# Altium footprint library Ultrascale_PcbLib.PcbLib: 126 footprints (part 1 of 8)
Each footprint in its own frame and in the unit in brackets; x right, y up, seen from the top. Pads: shape width x height; smd on the part's side, far side on the other; paste and mask are expansions set on the pad; w line width, h text height; cw(c..) or ccw(c..) is an arc to the next point about the centre after c.
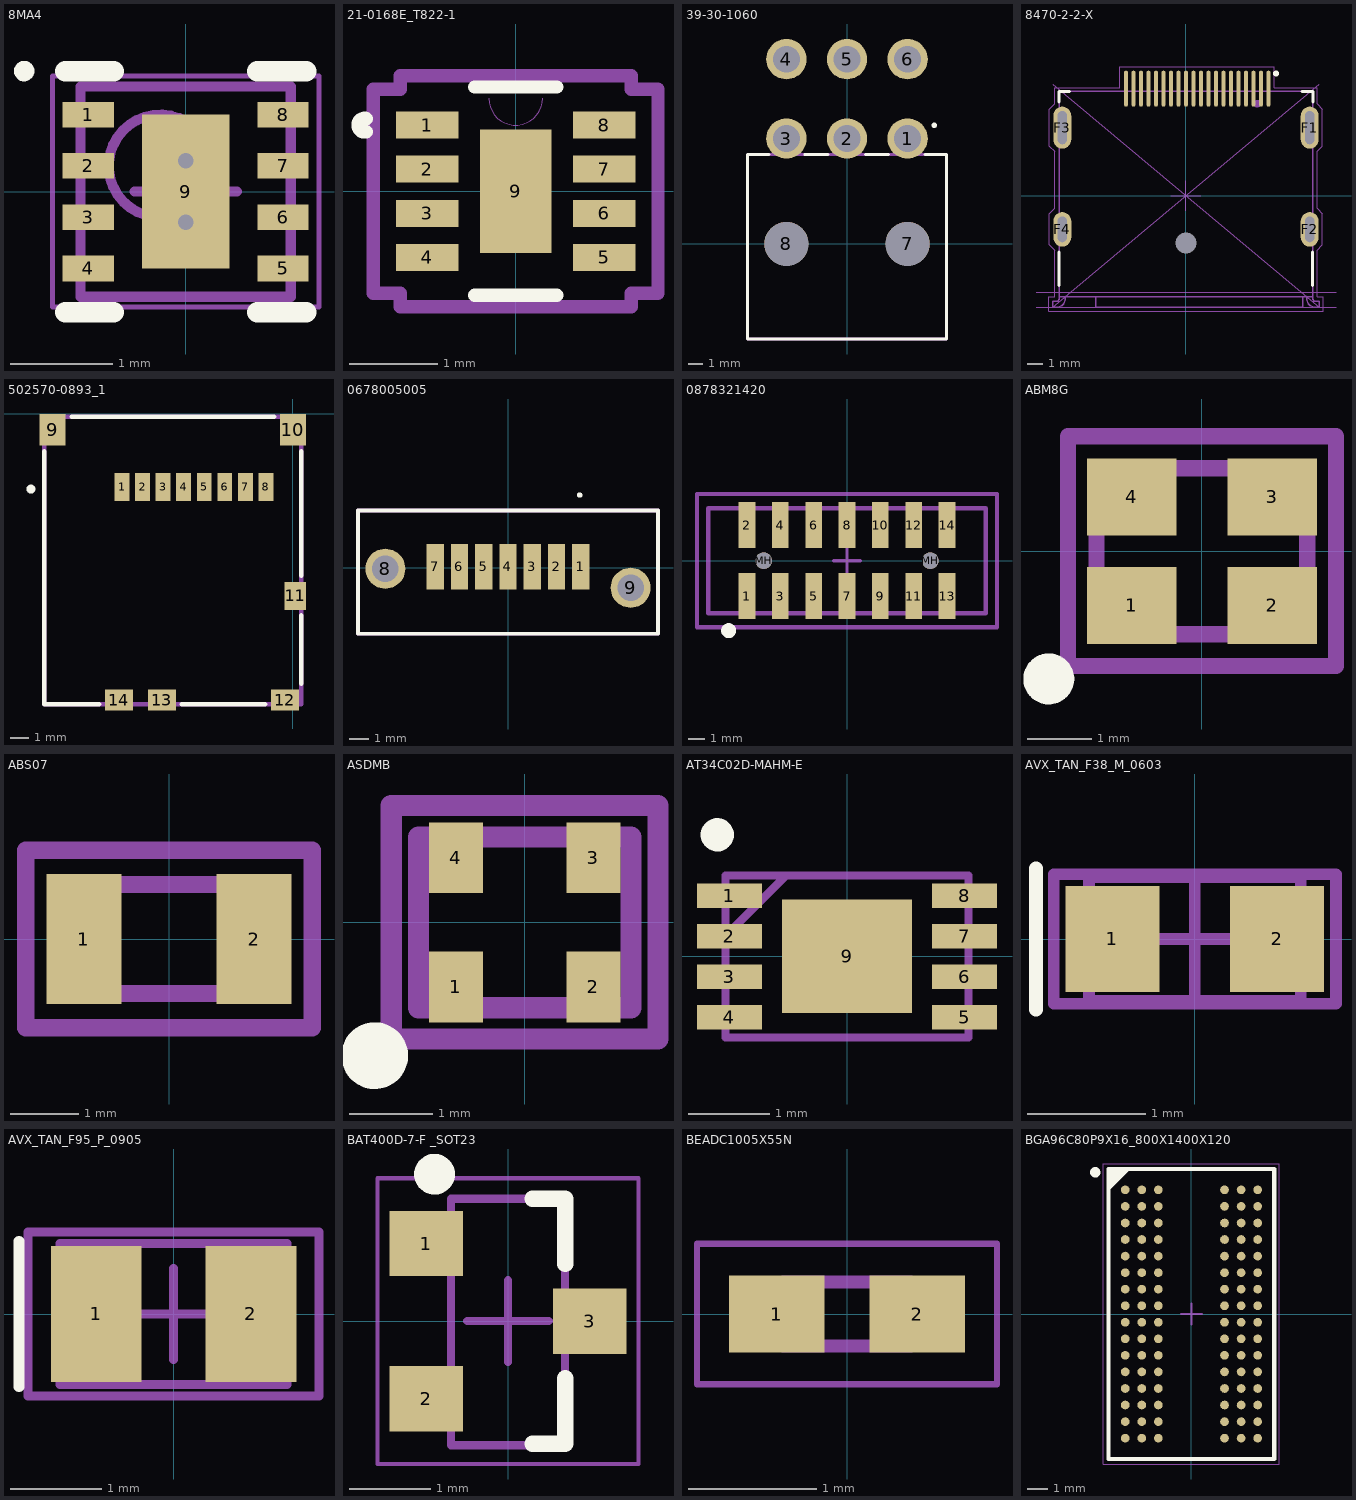
[diagram p0: the footprints below, top view; thin cyan lines are the x and y axes]

## 8MA4 [mm] "SON, 8-Leads, Body 2x2mm, Pitch 0.5mm"
height 0.6
pads (9):
  rect 0.5x0.25 smd: 1(-0.95,0.75) 2(-0.95,0.25) 3(-0.95,-0.25) 4(-0.95,-0.75) 5(0.95,-0.75) 6(0.95,-0.25) 7(0.95,0.25) 8(0.95,0.75)
  rect 0.85x1.5 smd: 9(0,0)
via 0,0.3 diameter 0.3 hole 0.152
via 0,-0.3 diameter 0.3 hole 0.152
Top Overlay:
  circle w0.1: c-1.575,1.175 r0.05
  lines w0.2: -1.175,-1.175 -0.7,-1.175 ; -1.175,1.175 -0.7,1.175 ; 0.7,-1.175 1.175,-1.175 ; 0.7,1.175 1.175,1.175
Mechanical 13:
  circle w0.1: c-0.25,0.25 r0.5
  lines w0.1: -1.025,-1.025 -1.025,1.025 1.025,1.025 1.025,-1.025 -1.025,-1.025
Mechanical 15:
  lines w0.05: -1.3,-1.125 -1.3,1.125 1.3,1.125 1.3,-1.125 -1.3,-1.125
  lines w0.1: -0.5,0 0.5,0 ; 0,-0.5 0,0.5
3D body: height 0.6, standoff 0, extent -1.024,-1.024 1.024,1.024

## 21-0168E_T822-1 [mil]
pads (9):
  rect 28x12 smd: 1(-39.5,29.53) 2(-39.5,9.84) 3(-39.5,-9.84) 4(-39.5,-29.53) 5(39.5,-29.53) 6(39.5,-9.84) 7(39.5,9.84) 8(39.5,29.53)
  rect 32x55 smd paste-27: 9(0,0)
Top Overlay:
  lines w6: -66.6,26.62 cw(c-67.34,29.53) -66.6,32.43 ; -18.34,-46.5 18.34,-46.5 ; -18.34,46.5 18.34,46.5
Top Paste:
  region: 16,27.5 -16,27.5 -16,-27.5 16,-27.5
Mechanical 13:
  lines w0: -12,41.5 ccw(c0,41.5) 12,41.5
Mechanical 15:
  lines w6: -63.5,-45.53 -51.5,-45.53 -51.5,-51.5 51.5,-51.5 51.5,-45.53 63.5,-45.53 63.5,45.53 51.5,45.53 51.5,51.5 -51.5,51.5 -51.5,45.53 -63.5,45.53 -63.5,-45.53
3D body: height 10, standoff 0, extent 0,0 10,10
3D body "MAX8902BATA+T.stp": height 31.5, standoff 0, extent -41.33,-39.36 41.35,39.38

## 39-30-1060 [mm]
pads (8):
  round 2.8 hole 1.85: 1(4.2,7.3) 2(0,7.3) 3(-4.2,7.3) 4(-4.2,12.8) 5(0,12.8) 6(4.2,12.8)
  round 3.05 hole 3.05 unplated: 7(4.2,0) 8(-4.2,0)
Top Overlay:
  circle w0.2: c6.048,8.213 r0.092
  lines w0.2: -5.4,6.2 -6.9,6.2 -6.9,-6.6 6.9,-6.6 6.9,6.2 5.4,6.2 ; -2.93,6.2 -1.315,6.2 ; 1.27,6.2 2.885,6.2
Mechanical 15:
  lines w0.2: -6.9,-6.6 6.9,-6.6 6.9,6.2 -6.9,6.2 -6.9,-6.6
3D body "39-30-1060.stp": height 11.01, standoff -3.99, extent -6.9,-6.567 7.3,13.367

## 8470-2-2-X [mm]
pads (25):
  oval 0.28x2.4 smd: 1(5.5,7.142) 2(5,7.142) 3(4.5,7.142) 4(4,7.142) 5(3.5,7.142) 6(3,7.142) 7(2.5,7.142) 8(2,7.142) 9(1.5,7.142) 10(1,7.142) 11(0.5,7.142) 12(0,7.142) 13(-0.5,7.142) 14(-1,7.142) 15(-1.5,7.142) 16(-2,7.142) 17(-2.5,7.142) 18(-3,7.142) 19(-3.5,7.142) 20(-4,7.142)
  oval 1.2x2.8 hole 0.6 slot 2.2 at 90 deg: F1(8.25,4.542) F3(-8.25,4.542)
  oval 1.2x2.3 hole 0.6 slot 1.7 at 90 deg: F2(8.25,-2.238) F4(-8.25,-2.238)
  round 0 hole 1.4 unplated: H1(0,-3.138)
Top Overlay:
  circle w0.2: c6,8.152 r0.1
  lines w0.2: -8.45,-5.998 -8.45,-3.748 ; -8.45,6.252 -8.45,6.952 -7.75,6.952 ; 7.75,6.952 8.45,6.952 8.45,6.252 ; 8.45,-5.998 8.45,-3.748
Mechanical 13:
  circle w0.5: c4.75,6.142 r0.01
  lines w0.1: -8.045,-6.738 -8.045,-6.838 cw(c-8.645,-6.838) -8.645,-7.438 -8.895,-7.438 -8.895,-7.038 -8.645,-7.038 ccw(c-8.645,-6.843) -8.45,-6.843 -8.45,-6.738 ; -6,-6.738 -6,-7.438 7.645,-7.438 7.795,-7.438 7.795,-6.738 ; 8.045,-6.738 8.045,-6.838 ccw(c8.645,-6.838) 8.645,-7.438 8.895,-7.438 8.895,-7.038 8.645,-7.038 cw(c8.645,-6.843) 8.45,-6.843 8.45,-6.738 ; -8.45,-6.738 -8.45,6.952 8.45,6.952 8.45,-6.738 ; -8.45,-6.738 8.45,-6.738
  text ".Designator" at 1.25,0.7 h1
Mechanical 15:
  lines w0.05: -10,-7.438 10,-7.438 ; -10,-6.418 10,-6.418 ; -8.895,-7.438 8.89,7.442 ; -8.895,7.442 8.89,-7.438 ; -1,0 1,0 ; 0,-1 0,1 ; -9.15,-7.698 9.15,-7.698 9.15,-6.748 8.75,-6.748 8.75,-3.628 9.1,-3.278 9.1,-1.248 9.1,-1.198 8.75,-0.848 8.75,2.952 9.1,3.302 9.1,5.782 8.75,6.132 8.75,7.202 5.9,7.202 5.9,8.602 -4.4,8.602 -4.4,7.202 -8.75,7.202 -8.75,6.132 -9.1,5.782 -9.1,3.302 -8.75,2.952 -8.75,-0.848 -9.1,-1.198 -9.1,-1.248 -9.1,-3.278 -8.75,-3.628 -8.75,-6.748 -9.15,-6.748 -9.15,-7.698
  text "PCB Edge" at 0.95,-6.2 h0.5
  text "Connector Edge" at 0.9,-7.25 h0.5
3D body "472720001.stp": height 6.65, standoff -2.1, extent -8.895,-7.448 8.89,7.442

## 502570-0893_1 [mm] "CONN MICRO SD CARD PUSH-PUSH R/A"
pads (14):
  rect 0.8x1.5 smd: 1(-9.15,-3.9) 2(-8.05,-3.9) 3(-6.95,-3.9) 4(-5.85,-3.9) 5(-4.75,-3.9) 6(-3.65,-3.9) 7(-2.55,-3.9) 8(-1.45,-3.9)
  rect 1.4x1.7 smd: 9(-12.875,-0.85) 10(0,-0.85)
  rect 1.15x1.5 smd: 11(0.125,-9.75)
  rect 1.5x1.15 smd: 12(-0.425,-15.325) 13(-7.025,-15.325) 14(-9.325,-15.325)
Top Overlay:
  circle w0.254: c-14.037,-4.023 r0.114
  lines w0.254: -13.325,-2 -13.325,-15.55 -10.393,-15.55 ; -11.85,-0.15 -1.011,-0.15 ; -5.95,-15.55 -1.5,-15.55 ; 0.45,-14.453 0.45,-10.8 ; 0.45,-8.669 0.45,-2
Mechanical 15:
  lines w0.254: -13.325,-15.55 -13.325,-0.15 0.45,-0.15 0.45,-15.55 -13.325,-15.55
3D body "5025700893.stp": height 1.81, standoff 0.01, extent -13.4,-15.6 0.4,-0.1

## 0678005005 [mm]
pads (9):
  rect 0.9x2.4 smd: 1(3.795,0.05) 2(2.525,0.05) 3(1.255,0.05) 4(-0.015,0.05) 5(-1.285,0.05) 6(-2.555,0.05) 7(-3.825,0.05)
  round 2.1 hole 1.4: 8(-6.43,-0.05) 9(6.4,-1.05)
Top Overlay:
  circle w0.2: c3.737,3.8 r0.04
  lines w0.2: -7.86,-3.45 -7.86,3 7.83,3 7.83,-3.45 -7.86,-3.45
Mechanical 15:
  lines w0.2: -7.86,-3.45 -7.86,3 7.83,3 7.83,-3.45 -7.86,-3.45

## 0878321420 [mm] "CONN HEADER 14POS 2MM VERT SMD"
height 7.6
pads (16):
  rect 1x2.75 smd paste+0.05 mask+0.05: 1(-6,-2.13) 2(-6,2.13) 3(-4,-2.13) 4(-4,2.13) 5(-2,-2.13) 6(-2,2.13) 7(0,-2.13) 8(0,2.13) 9(2,-2.13) 10(2,2.13) 11(4,-2.13) 12(4,2.13) 13(6,-2.13) 14(6,2.13)
  round 1 hole 1 unplated paste-2 mask+0.1: MH(-5,0) MH(5,0)
Top Overlay:
  circle w0.5: c-7.1,-4.2 r0.2
Mechanical 13:
  lines w0.254: -8.325,-3.15 8.325,-3.15 8.325,3.15 -8.325,3.15 -8.325,-3.15
Mechanical 15:
  lines w0.2: -0.8,0 0.8,0 ; 0,-0.8 0,0.8
  lines w0.254: -9,-4 9,-4 9,4 -9,4 -9,-4
Mechanical 29:
  text ".Designator" at -6.74,-3.07 h1.52
3D body "878321420.stp": height 7.6, standoff -0.75, extent -8.325,-3.15 8.325,3.15

## ABM8G [mm] "Abracon ABM8G Series Crystals"
height 1
pads (4):
  rect 1.4x1.2 smd mask+0.05: 1(-1.1,-0.85) 2(1.1,-0.85) 3(1.1,0.85) 4(-1.1,0.85)
Top Overlay:
  circle w0.4: c-2.4,-2 r0.2
Mechanical 13:
  lines w0.254: -1.65,-1.3 -1.65,1.3 1.65,1.3 1.65,-1.3 -1.65,-1.3
Mechanical 15:
  lines w0.254: -2.1,-1.8 2.1,-1.8 2.1,1.8 -2.1,1.8 -2.1,-1.8
3D body "ABM8G.STEP": height 0.99, standoff 0, extent -1.6,-1.244 1.6,1.245

## ABS07 [mm] "Abracon ABS07 Series Crystals"
height 0.9
pads (2):
  rect 1.1x1.9 smd mask+0.05: 1(-1.25,0) 2(1.25,0)
Mechanical 13:
  lines w0.254: -1.65,-0.8 -1.65,0.8 1.65,0.8 1.65,-0.8 -1.65,-0.8
Mechanical 15:
  lines w0.254: -2.1,-1.3 2.1,-1.3 2.1,1.3 -2.1,1.3 -2.1,-1.3
3D body "ABS07.STEP": height 0.89, standoff 0, extent -1.6,-0.749 1.6,0.749

## ASDMB [mm] "Abracon ASDMB Series Oscillators"
height 0.9
pads (4):
  rect 0.65x0.85 smd mask+0.05: 1(-0.825,-0.775) 2(0.825,-0.775) 3(0.825,0.775) 4(-0.825,0.775)
Top Overlay:
  circle w0.4: c-1.8,-1.6 r0.2
Mechanical 13:
  lines w0.254: -1.275,-1.025 -1.275,1.025 1.275,1.025 1.275,-1.025 -1.275,-1.025
Mechanical 15:
  lines w0.254: -1.6,-1.4 1.6,-1.4 1.6,1.4 -1.6,1.4 -1.6,-1.4
3D body "ASDMB.STEP": height 0.86, standoff 0.01, extent -1.25,-1 1.25,1

## AT34C02D-MAHM-E [mm] "IC EEPROM 2KBIT 1MHZ 8UDFN"
pads (9):
  rect 0.8x0.3 smd mask+0.07: 1(-1.45,0.75) 2(-1.45,0.25) 3(-1.45,-0.25) 4(-1.45,-0.75) 5(1.45,-0.75) 6(1.45,-0.25) 7(1.45,0.25) 8(1.45,0.75)
  rect 1.6x1.4 smd mask+0.07: 9(0,0)
Top Overlay:
  circle w0.25: c-1.6,1.5 r0.08
Mechanical 15:
  lines w0.1: -1.5,0.25 -0.75,1 ; -1.5,-1 1.5,-1 1.5,1 -1.5,1 -1.5,-1
3D body "AT34C02D-MAHM-E.stp": height 0.6, standoff 0, extent -1.55,-1 1.55,1

## AVX_TAN_F38_M_0603 [mm] "AVX F38 Series Tantalum Cap. M Package"
height 0.9
pads (2):
  rect 0.8x0.9 smd: 1(-0.7,0) 2(0.7,0)
Top Overlay:
  lines w0.12: -1.35,-0.6 -1.35,0.6
Mechanical 13:
  lines w0.1: -0.9,-0.525 0.9,-0.525 0.9,0.525 -0.9,0.525 -0.9,-0.525
Mechanical 15:
  lines w0.1: -0.475,0 0.475,0 ; 0,-0.475 0,0.475 ; -1.2,-0.55 1.2,-0.55 1.2,0.55 -1.2,0.55 -1.2,-0.55
3D body "F38_98_M.stp": height 0.8, standoff 0, extent -0.8,-0.425 0.8,0.425

## AVX_TAN_F95_P_0905 [mm] "AVX F95 Series Tantalum Cap. P Package"
height 1.2
pads (2):
  rect 1x1.5 smd: 1(-0.85,0) 2(0.85,0)
Top Overlay:
  lines w0.12: -1.7,-0.8 -1.7,0.8
Mechanical 13:
  lines w0.1: -1.25,-0.775 -1.25,0.775 1.25,0.775 1.25,-0.775 -1.25,-0.775
Mechanical 15:
  lines w0.1: -0.5,0 0.5,0 ; 0,-0.5 0,0.5 ; -1.6,-0.9 -1.6,0.9 1.6,0.9 1.6,-0.9 -1.6,-0.9
3D body "F95__P.stp": height 1, standoff 0, extent -1.3,-0.625 0.9,0.625

## BAT400D-7-F _SOT23 [mm] "SOT23, 3-Leads, Body 2.9x1.3 mm, Pitch 0.95 mm"
height 1.1
pads (3):
  rect 0.9x0.8 smd mask+0.05: 1(-1,0.95) 2(-1,-0.95) 3(1,0)
Top Overlay:
  circle w0.25: c-0.9,1.8 r0.125
  lines w0.2: 0.3,-1.5 0.7,-1.5 0.7,-0.7 ; 0.3,1.5 0.7,1.5 0.7,0.7
Mechanical 13:
  lines w0.1: -0.7,-1.52 -0.7,1.5 0.7,1.5 0.7,-1.52 -0.7,-1.52
Mechanical 15:
  lines w0.05: -1.6,-1.75 -1.6,1.75 1.6,1.75 1.6,-1.75 -1.6,-1.75
  lines w0.1: -0.5,0 0.5,0 ; 0,-0.5 0,0.5
3D body "DBZ0003A.stp": height 1, standoff 0, extent -1.27,-1.46 1.27,1.46

## BEADC1005X55N [mm] "FERRITE BEAD 600 OHM 0.3A 0402"
pads (2):
  rect 0.75x0.6 smd: 1(-0.55,0) 2(0.55,0)
Mechanical 15:
  lines w0.1: -0.5,-0.25 0.5,-0.25 0.5,0.25 -0.5,0.25 -0.5,-0.25
Mechanical 20:
  lines w0.05: -1.175,-0.55 1.175,-0.55 1.175,0.55 -1.175,0.55 -1.175,-0.55
3D body "BLM15AG601SN1D.stp": height 0.55, standoff 0, extent -0.5,-0.25 0.5,0.25

## BGA96C80P9X16_800X1400X120 [mm] "BGA, 96-Leads, Body 8.00x14.00mmx1.20mm, Pitch 0.80mm"
height 1.2
pads (96):
  round 0.42 smd mask+0.05: A1(-3.2,6) A2(-2.4,6) A3(-1.6,6) A7(1.6,6) A8(2.4,6) A9(3.2,6) B1(-3.2,5.2) B2(-2.4,5.2) B3(-1.6,5.2) B7(1.6,5.2) B8(2.4,5.2) B9(3.2,5.2) C1(-3.2,4.4) C2(-2.4,4.4) C3(-1.6,4.4) C7(1.6,4.4) C8(2.4,4.4) C9(3.2,4.4) D1(-3.2,3.6) D2(-2.4,3.6) D3(-1.6,3.6) D7(1.6,3.6) D8(2.4,3.6) D9(3.2,3.6) E1(-3.2,2.8) E2(-2.4,2.8) E3(-1.6,2.8) E7(1.6,2.8) E8(2.4,2.8) E9(3.2,2.8) F1(-3.2,2) F2(-2.4,2) F3(-1.6,2) F7(1.6,2) F8(2.4,2) F9(3.2,2) G1(-3.2,1.2) G2(-2.4,1.2) G3(-1.6,1.2) G7(1.6,1.2) G8(2.4,1.2) G9(3.2,1.2) H1(-3.2,0.4) H2(-2.4,0.4) H3(-1.6,0.4) H7(1.6,0.4) H8(2.4,0.4) H9(3.2,0.4) J1(-3.2,-0.4) J2(-2.4,-0.4) J3(-1.6,-0.4) J7(1.6,-0.4) J8(2.4,-0.4) J9(3.2,-0.4) K1(-3.2,-1.2) K2(-2.4,-1.2) K3(-1.6,-1.2) K7(1.6,-1.2) K8(2.4,-1.2) K9(3.2,-1.2) L1(-3.2,-2) L2(-2.4,-2) L3(-1.6,-2) L7(1.6,-2) L8(2.4,-2) L9(3.2,-2) M1(-3.2,-2.8) M2(-2.4,-2.8) M3(-1.6,-2.8) M7(1.6,-2.8) M8(2.4,-2.8) M9(3.2,-2.8) N1(-3.2,-3.6) N2(-2.4,-3.6) N3(-1.6,-3.6) N7(1.6,-3.6) N8(2.4,-3.6) N9(3.2,-3.6) P1(-3.2,-4.4) P2(-2.4,-4.4) P3(-1.6,-4.4) P7(1.6,-4.4) P8(2.4,-4.4) P9(3.2,-4.4) R1(-3.2,-5.2) R2(-2.4,-5.2) R3(-1.6,-5.2) R7(1.6,-5.2) R8(2.4,-5.2) R9(3.2,-5.2) T1(-3.2,-6) T2(-2.4,-6) T3(-1.6,-6) T7(1.6,-6) T8(2.4,-6) T9(3.2,-6)
Top Overlay:
  circle w0.25: c-4.65,6.85 r0.125
  region: -3.063,7 -4,6.063 -4,7
  lines w0.2: -4,6.063 -3.063,7 ; -4,-7 -4,7 4,7 4,-7 -4,-7
Mechanical 13:
  lines w0.1: -4,-7 -4,7 4,7 4,-7 -4,-7
Mechanical 15:
  lines w0.05: -4.25,-7.25 -4.25,7.25 4.25,7.25 4.25,-7.25 -4.25,-7.25
  lines w0.1: -0.5,0 0.5,0 ; 0,-0.5 0,0.5
3D body "BGA96C80P9X16_800X1400X120.step": height 1.2, standoff 0, extent -4,-7 4,7